# Altium footprint library connector_degson.PcbLib: 59 footprints (part 3 of 4)
Each footprint in its own frame and in the unit in brackets; x right, y up, seen from the top. Pads: shape width x height; smd on the part's side, far side on the other; paste and mask are expansions set on the pad; w line width, h text height; cw(c..) or ccw(c..) is an arc to the next point about the centre after c.
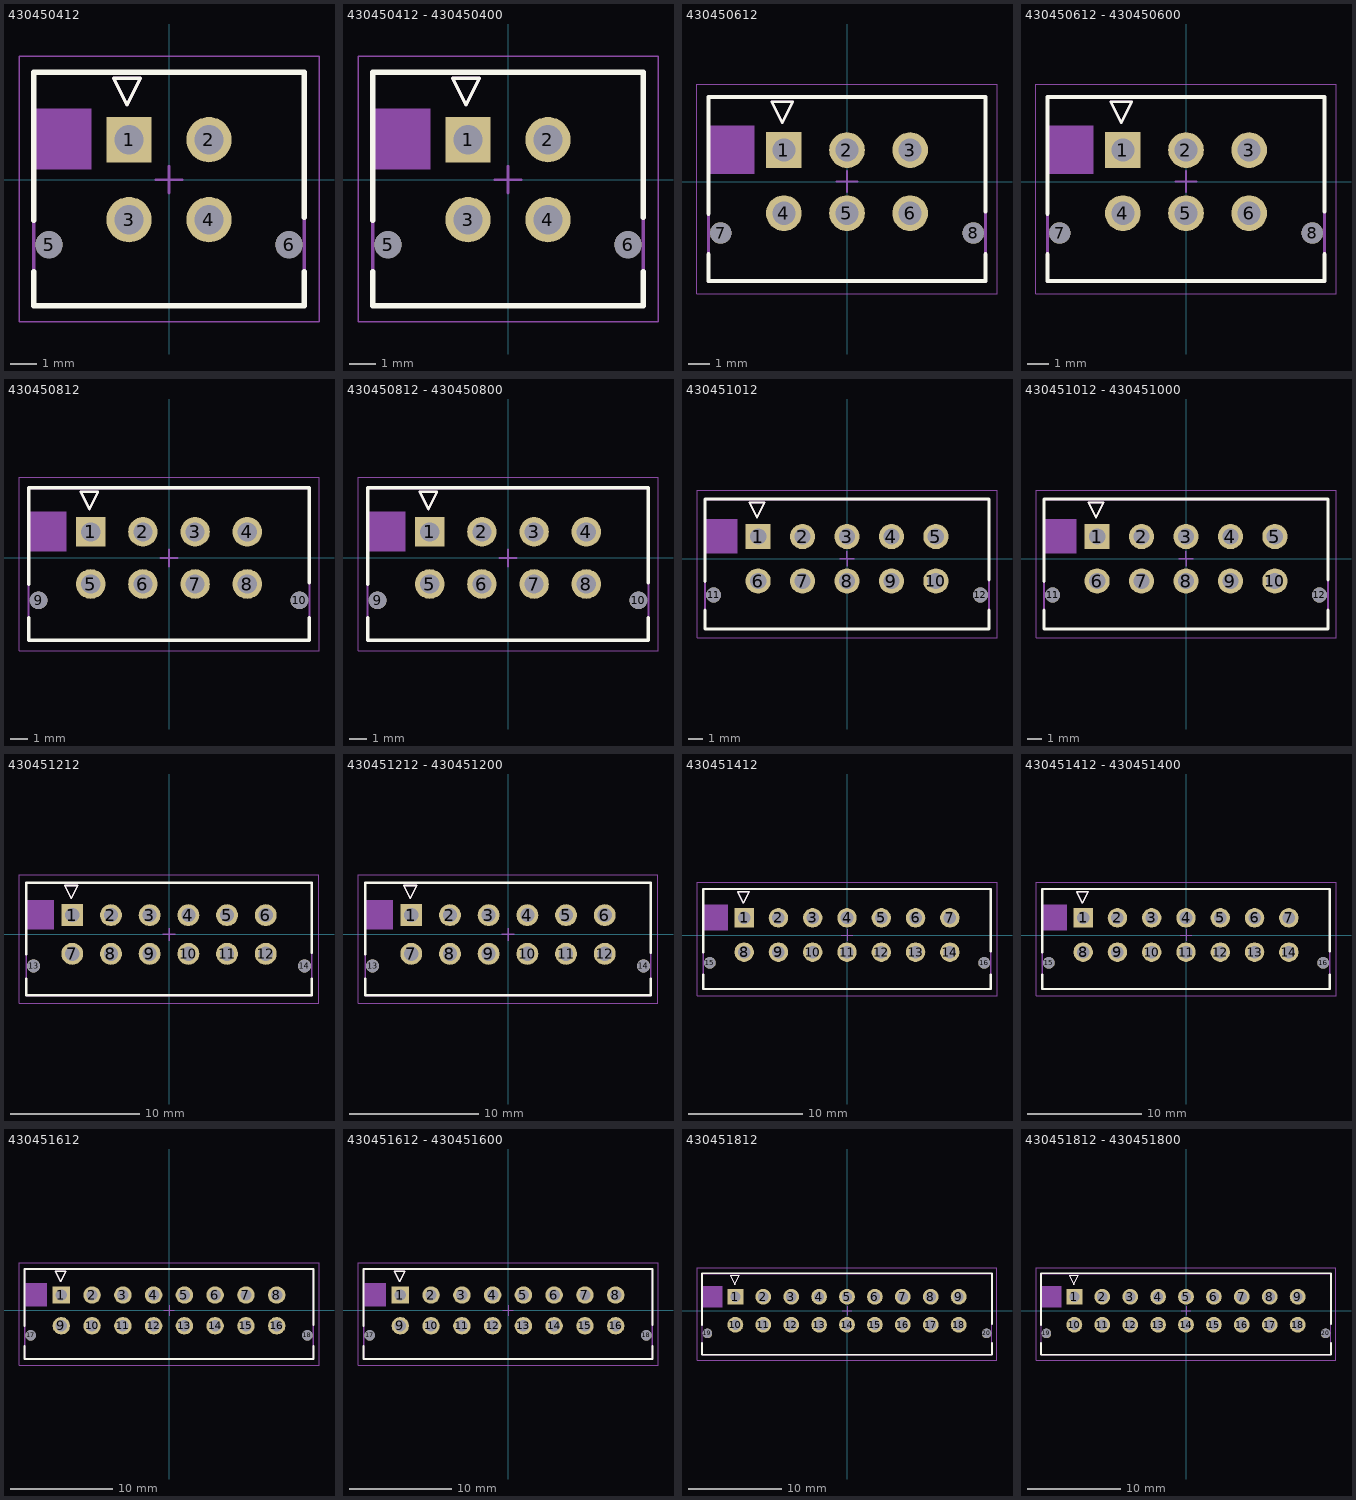
[diagram p2: the footprints below, top view; thin cyan lines are the x and y axes]

## 430450412 [mm] "Micro-Fit 3.0 Vertical Header, 3.00mm Pitch, Dual Row,  with PCB Polarizing Peg, 1.52µm Matte Tin Plating, Glow-Wire Capable, Black"
pads (6):
  rect 1.7x1.7 hole 1.1: 1(-1.5,1.5)
  round 1.7 hole 1.1: 2(1.5,1.5) 3(-1.5,-1.5) 4(1.5,-1.5)
  round 1.02 hole 1.02: 5(-4.5,-2.44) 6(4.5,-2.44)
Top Overlay:
  lines w0.127: -2.075,3.8 -1.075,3.8 -1.575,2.8 -2.075,3.8
  lines w0.2: -5.075,-3.45 -5.075,-4.725 5.075,-4.725 5.075,-3.45 ; -5.075,-1.525 -5.075,4.025 5.075,4.025 5.075,-1.42
Route Tool Path:
  text "%R" at -1.001,1.872 h1.27
Top Designator:
  text ".Designator" at -3.021,4.92 h0.6
Top Assembly:
  rectangle: -5.062,0.372 -2.904,2.678
  lines w0.127: -5.075,-4.75 -5.075,4 5.075,4 5.075,-4.75 -5.075,-4.75 ; -2.075,3.8 -1.575,2.8 -1.075,3.8 -2.075,3.8
Top Courtyard:
  lines w0.05: -5.625,-5.325 5.625,-5.325 5.625,4.625 -5.625,4.625 -5.625,-5.325
  lines w0.1: -0.5,0 0.5,0 ; 0,-0.5 0,0.5
3D body "0430450412.stp": height 10.05, standoff -3.04, extent -5.075,-4.83 5.075,3.94

## 430450412 - 430450400 [mm] "Micro-Fit 3.0 Vertical Header, 3.00mm Pitch, Dual Row,  with PCB Polarizing Peg, 1.52µm Matte Tin Plating, Glow-Wire Capable, Black"
pads (6):
  rect 1.7x1.7 hole 1.1: 1(-1.5,1.5)
  round 1.7 hole 1.1: 2(1.5,1.5) 3(-1.5,-1.5) 4(1.5,-1.5)
  round 1.02 hole 1.02: 5(-4.5,-2.44) 6(4.5,-2.44)
Top Overlay:
  lines w0.127: -2.075,3.8 -1.575,2.8 -1.075,3.8 -2.075,3.8
  lines w0.2: -5.075,-3.45 -5.075,-4.725 5.075,-4.725 5.075,-3.45 ; -5.075,-1.525 -5.075,4.025 5.075,4.025 5.075,-1.42
Route Tool Path:
  text "%R" at -1.001,1.872 h1.27
Top Designator:
  text ".Designator" at -3.021,4.92 h0.6
Top Assembly:
  rectangle: -5.062,0.372 -2.904,2.678
  lines w0.127: -5.075,-4.75 5.075,-4.75 5.075,4 -5.075,4 -5.075,-4.75 ; -2.075,3.8 -1.575,2.8 -1.075,3.8 -2.075,3.8
Top Courtyard:
  lines w0.05: -5.625,-5.325 -5.625,4.625 5.625,4.625 5.625,-5.325 -5.625,-5.325
  lines w0.1: -0.5,0 0.5,0 ; 0,-0.5 0,0.5
3D body "0430450412.stp": height 10.05, standoff -3.04, extent -5.075,-4.83 5.075,3.94
3D body "0430250400.stp": height 17.8, standoff 3.8, extent -4.14,-6.7 4.13,4.13

## 430450612 [mm] "Micro-Fit 3.0 Vertical Header, 3.00mm Pitch, Dual Row,  with PCB Polarizing Peg, 1.52µm Matte Tin Plating, Glow-Wire Capable, Black"
pads (8):
  rect 1.7x1.7 hole 1.1: 1(-3,1.5)
  round 1.7 hole 1.1: 2(0,1.5) 3(3,1.5) 4(-3,-1.5) 5(0,-1.5) 6(3,-1.5)
  round 1.02 hole 1.02: 7(-6,-2.44) 8(6,-2.44)
Top Overlay:
  lines w0.127: -3.575,3.8 -2.575,3.8 -3.075,2.8 -3.575,3.8
  lines w0.2: -6.575,-3.45 -6.575,-4.725 6.575,-4.725 6.575,-3.45 ; -6.575,-1.525 -6.575,4.025 6.575,4.025 6.575,-1.42
Route Tool Path:
  text "%R" at -2.501,1.872 h1.27
Top Designator:
  text ".Designator" at -3.033,4.975 h0.6
Top Assembly:
  rectangle: -6.562,0.372 -4.404,2.678
  lines w0.127: -6.575,-4.75 -6.575,4 6.575,4 6.575,-4.75 -6.575,-4.75 ; -3.575,3.8 -2.575,3.8 -3.075,2.8 -3.575,3.8
Top Courtyard:
  lines w0.05: -7.125,-5.325 7.125,-5.325 7.125,4.625 -7.125,4.625 -7.125,-5.325
  lines w0.1: -0.5,0 0.5,0 ; 0,-0.5 0,0.5
3D body "0430450612.stp": height 10.05, standoff -3.04, extent -6.575,-4.83 6.575,3.94

## 430450612 - 430450600 [mm] "Micro-Fit 3.0 Vertical Header, 3.00mm Pitch, Dual Row,  with PCB Polarizing Peg, 1.52µm Matte Tin Plating, Glow-Wire Capable, Black"
pads (8):
  rect 1.7x1.7 hole 1.1: 1(-3,1.5)
  round 1.7 hole 1.1: 2(0,1.5) 3(3,1.5) 4(-3,-1.5) 5(0,-1.5) 6(3,-1.5)
  round 1.02 hole 1.02: 7(-6,-2.44) 8(6,-2.44)
Top Overlay:
  lines w0.127: -3.575,3.8 -2.575,3.8 -3.075,2.8 -3.575,3.8
  lines w0.2: -6.575,-3.45 -6.575,-4.725 6.575,-4.725 6.575,-3.45 ; -6.575,-1.525 -6.575,4.025 6.575,4.025 6.575,-1.42
Route Tool Path:
  text "%R" at -2.501,1.872 h1.27
Top Designator:
  text ".Designator" at -3.033,4.975 h0.6
Top Assembly:
  rectangle: -6.562,0.372 -4.404,2.678
  lines w0.127: -6.575,-4.75 -6.575,4 6.575,4 6.575,-4.75 -6.575,-4.75 ; -3.575,3.8 -2.575,3.8 -3.075,2.8 -3.575,3.8
Top Courtyard:
  lines w0.05: -7.125,-5.325 7.125,-5.325 7.125,4.625 -7.125,4.625 -7.125,-5.325
  lines w0.1: -0.5,0 0.5,0 ; 0,-0.5 0,0.5
3D body "0430250600.stp": height 17.8, standoff 3.8, extent -4.93,-6.7 4.92,4.13
3D body "0430450612.stp": height 10.05, standoff -3.04, extent -6.575,-4.83 6.575,3.94

## 430450812 [mm] "Micro-Fit 3.0 Vertical Header, 3.00mm Pitch, Dual Row,  with PCB Polarizing Peg, 1.52µm Matte Tin Plating, Glow-Wire Capable, Black"
pads (10):
  rect 1.7x1.7 hole 1.1: 1(-4.5,1.5)
  round 1.7 hole 1.1: 2(-1.5,1.5) 3(1.5,1.5) 4(4.5,1.5) 5(-4.5,-1.5) 6(-1.5,-1.5) 7(1.5,-1.5) 8(4.5,-1.5)
  round 1.02 hole 1.02: 9(-7.5,-2.44) 10(7.5,-2.44)
Top Overlay:
  lines w0.127: -5.075,3.8 -4.075,3.8 -4.575,2.8 -5.075,3.8
  lines w0.2: -8.075,-3.45 -8.075,-4.725 8.075,-4.725 8.075,-3.45 ; -8.075,-1.525 -8.075,4.025 8.075,4.025 8.075,-1.42
Route Tool Path:
  text "%R" at -4.001,1.872 h1.27
Top Designator:
  text ".Designator" at -1.474,5.1 h0.6
Top Assembly:
  rectangle: -8.062,0.372 -5.904,2.678
  lines w0.127: -8.075,-4.75 -8.075,4 8.075,4 8.075,-4.75 -8.075,-4.75 ; -5.075,3.8 -4.075,3.8 -4.575,2.8 -5.075,3.8
Top Courtyard:
  lines w0.05: -8.625,-5.325 8.625,-5.325 8.625,4.625 -8.625,4.625 -8.625,-5.325
  lines w0.1: -0.5,0 0.5,0 ; 0,-0.5 0,0.5
3D body "0430450812.stp": height 10.05, standoff -3.04, extent -8.075,-4.83 8.075,3.94

## 430450812 - 430450800 [mm] "Micro-Fit 3.0 Vertical Header, 3.00mm Pitch, Dual Row,  with PCB Polarizing Peg, 1.52µm Matte Tin Plating, Glow-Wire Capable, Black"
pads (10):
  rect 1.7x1.7 hole 1.1: 1(-4.5,1.5)
  round 1.7 hole 1.1: 2(-1.5,1.5) 3(1.5,1.5) 4(4.5,1.5) 5(-4.5,-1.5) 6(-1.5,-1.5) 7(1.5,-1.5) 8(4.5,-1.5)
  round 1.02 hole 1.02: 9(-7.5,-2.44) 10(7.5,-2.44)
Top Overlay:
  lines w0.127: -5.075,3.8 -4.575,2.8 -4.075,3.8 -5.075,3.8
  lines w0.2: -8.075,-3.45 -8.075,-4.725 8.075,-4.725 8.075,-3.45 ; -8.075,-1.525 -8.075,4.025 8.075,4.025 8.075,-1.42
Route Tool Path:
  text "%R" at -4.001,1.872 h1.27
Top Designator:
  text ".Designator" at -1.474,5.1 h0.6
Top Assembly:
  rectangle: -8.062,0.372 -5.904,2.678
  lines w0.127: -8.075,-4.75 8.075,-4.75 8.075,4 -8.075,4 -8.075,-4.75 ; -5.075,3.8 -4.575,2.8 -4.075,3.8 -5.075,3.8
Top Courtyard:
  lines w0.05: -8.625,-5.325 -8.625,4.625 8.625,4.625 8.625,-5.325 -8.625,-5.325
  lines w0.1: -0.5,0 0.5,0 ; 0,-0.5 0,0.5
3D body "0430250800.stp": height 17.8, standoff 3.8, extent -6.43,-6.7 6.42,4.13
3D body "0430450812.stp": height 10.05, standoff -3.04, extent -8.075,-4.83 8.075,3.94

## 430451012 [mm] "Micro-Fit 3.0 Vertical Header, 3.00mm Pitch, Dual Row,  with PCB Polarizing Peg, 1.52µm Matte Tin Plating, Glow-Wire Capable, Black"
pads (12):
  rect 1.7x1.7 hole 1.1: 1(-6,1.5)
  round 1.7 hole 1.1: 2(-3,1.5) 3(0,1.5) 4(3,1.5) 5(6,1.5) 6(-6,-1.5) 7(-3,-1.5) 8(0,-1.5) 9(3,-1.5) 10(6,-1.5)
  round 1.02 hole 1.02: 11(-9,-2.44) 12(9,-2.44)
Top Overlay:
  lines w0.127: -6.575,3.8 -5.575,3.8 -6.075,2.8 -6.575,3.8
  lines w0.2: -9.575,-3.45 -9.575,-4.725 9.575,-4.725 9.575,-3.45 ; -9.575,-1.525 -9.575,4.025 9.575,4.025 9.575,-1.42
Route Tool Path:
  text "%R" at -5.501,1.872 h1.27
Top Designator:
  text ".Designator" at -2.974,5.1 h0.6
Top Assembly:
  rectangle: -9.562,0.372 -7.404,2.678
  lines w0.127: -9.575,-4.75 -9.575,4 9.575,4 9.575,-4.75 -9.575,-4.75 ; -6.575,3.8 -5.575,3.8 -6.075,2.8 -6.575,3.8
Top Courtyard:
  lines w0.05: -10.125,-5.325 10.125,-5.325 10.125,4.625 -10.125,4.625 -10.125,-5.325
  lines w0.1: -0.5,0 0.5,0 ; 0,-0.5 0,0.5
3D body "43045-1012.stp": height 9.95, standoff -3.14, extent -9.575,-4.83 9.575,3.94

## 430451012 - 430451000 [mm] "Micro-Fit 3.0 Vertical Header, 3.00mm Pitch, Dual Row,  with PCB Polarizing Peg, 1.52µm Matte Tin Plating, Glow-Wire Capable, Black"
pads (12):
  rect 1.7x1.7 hole 1.1: 1(-6,1.5)
  round 1.7 hole 1.1: 2(-3,1.5) 3(0,1.5) 4(3,1.5) 5(6,1.5) 6(-6,-1.5) 7(-3,-1.5) 8(0,-1.5) 9(3,-1.5) 10(6,-1.5)
  round 1.02 hole 1.02: 11(-9,-2.44) 12(9,-2.44)
Top Overlay:
  lines w0.127: -6.575,3.8 -5.575,3.8 -6.075,2.8 -6.575,3.8
  lines w0.2: -9.575,-3.45 -9.575,-4.725 9.575,-4.725 9.575,-3.45 ; -9.575,-1.525 -9.575,4.025 9.575,4.025 9.575,-1.42
Route Tool Path:
  text "%R" at -5.501,1.872 h1.27
Top Designator:
  text ".Designator" at -2.974,5.1 h0.6
Top Assembly:
  rectangle: -9.562,0.372 -7.404,2.678
  lines w0.127: -9.575,-4.75 -9.575,4 9.575,4 9.575,-4.75 -9.575,-4.75 ; -6.575,3.8 -5.575,3.8 -6.075,2.8 -6.575,3.8
Top Courtyard:
  lines w0.05: -10.125,-5.325 10.125,-5.325 10.125,4.625 -10.125,4.625 -10.125,-5.325
  lines w0.1: -0.5,0 0.5,0 ; 0,-0.5 0,0.5
3D body "0430251000.stp": height 17.8, standoff 3.8, extent -7.93,-6.7 7.92,4.13
3D body "43045-1012.stp": height 9.95, standoff -3.14, extent -9.575,-4.83 9.575,3.94

## 430451212 [mm] "Micro-Fit 3.0 Vertical Header, 3.00mm Pitch, Dual Row,  with PCB Polarizing Peg, 1.52µm Matte Tin Plating, Glow-Wire Capable, Black"
pads (14):
  rect 1.7x1.7 hole 1.1: 1(-7.5,1.5)
  round 1.7 hole 1.1: 2(-4.5,1.5) 3(-1.5,1.5) 4(1.5,1.5) 5(4.5,1.5) 6(7.5,1.5) 7(-7.5,-1.5) 8(-4.5,-1.5) 9(-1.5,-1.5) 10(1.5,-1.5) 11(4.5,-1.5) 12(7.5,-1.5)
  round 1.02 hole 1.02: 13(-10.5,-2.44) 14(10.5,-2.44)
Top Overlay:
  lines w0.127: -8.075,3.8 -7.575,2.8 -7.075,3.8 -8.075,3.8
  lines w0.2: -11.075,-3.45 -11.075,-4.725 11.075,-4.725 11.075,-3.45 ; -11.075,-1.525 -11.075,4.025 11.075,4.025 11.075,-1.42
Route Tool Path:
  text "%R" at -7.001,1.872 h1.27
Top Designator:
  text ".Designator" at -4.474,5.1 h0.6
Top Assembly:
  rectangle: -11.062,0.372 -8.904,2.678
  lines w0.127: -11.075,-4.75 11.075,-4.75 11.075,4 -11.075,4 -11.075,-4.75 ; -8.075,3.8 -7.575,2.8 -7.075,3.8 -8.075,3.8
Top Courtyard:
  lines w0.05: -11.625,-5.325 -11.625,4.625 11.625,4.625 11.625,-5.325 -11.625,-5.325
  lines w0.1: -0.5,0 0.5,0 ; 0,-0.5 0,0.5
3D body "0430451212.stp": height 10.05, standoff -3.04, extent -11.075,-4.83 11.075,3.94

## 430451212 - 430451200 [mm] "Micro-Fit 3.0 Vertical Header, 3.00mm Pitch, Dual Row,  with PCB Polarizing Peg, 1.52µm Matte Tin Plating, Glow-Wire Capable, Black"
pads (14):
  rect 1.7x1.7 hole 1.1: 1(-7.5,1.5)
  round 1.7 hole 1.1: 2(-4.5,1.5) 3(-1.5,1.5) 4(1.5,1.5) 5(4.5,1.5) 6(7.5,1.5) 7(-7.5,-1.5) 8(-4.5,-1.5) 9(-1.5,-1.5) 10(1.5,-1.5) 11(4.5,-1.5) 12(7.5,-1.5)
  round 1.02 hole 1.02: 13(-10.5,-2.44) 14(10.5,-2.44)
Top Overlay:
  lines w0.127: -8.075,3.8 -7.575,2.8 -7.075,3.8 -8.075,3.8
  lines w0.2: -11.075,-3.45 -11.075,-4.725 11.075,-4.725 11.075,-3.45 ; -11.075,-1.525 -11.075,4.025 11.075,4.025 11.075,-1.42
Route Tool Path:
  text "%R" at -7.001,1.872 h1.27
Top Designator:
  text ".Designator" at -4.474,5.1 h0.6
Top Assembly:
  rectangle: -11.062,0.372 -8.904,2.678
  lines w0.127: -11.075,-4.75 11.075,-4.75 11.075,4 -11.075,4 -11.075,-4.75 ; -8.075,3.8 -7.575,2.8 -7.075,3.8 -8.075,3.8
Top Courtyard:
  lines w0.05: -11.625,-5.325 -11.625,4.625 11.625,4.625 11.625,-5.325 -11.625,-5.325
  lines w0.1: -0.5,0 0.5,0 ; 0,-0.5 0,0.5
3D body "0430251200.stp": height 17.8, standoff 3.8, extent -9.43,-6.7 9.42,4.13
3D body "0430451212.stp": height 10.05, standoff -3.04, extent -11.075,-4.83 11.075,3.94

## 430451412 [mm] "Micro-Fit 3.0 Vertical Header, 3.00mm Pitch, Dual Row,  with PCB Polarizing Peg, 1.52µm Matte Tin Plating, Glow-Wire Capable, Black"
pads (16):
  rect 1.7x1.7 hole 1.1: 1(-9,1.5)
  round 1.7 hole 1.1: 2(-6,1.5) 3(-3,1.5) 4(0,1.5) 5(3,1.5) 6(6,1.5) 7(9,1.5) 8(-9,-1.5) 9(-6,-1.5) 10(-3,-1.5) 11(0,-1.5) 12(3,-1.5) 13(6,-1.5) 14(9,-1.5)
  round 1.02 hole 1.02: 15(-12,-2.44) 16(12,-2.44)
Top Overlay:
  lines w0.127: -9.575,3.8 -9.075,2.8 -8.575,3.8 -9.575,3.8
  lines w0.2: -12.575,-3.45 -12.575,-4.725 12.575,-4.725 12.575,-3.45 ; -12.575,-1.525 -12.575,4.025 12.575,4.025 12.575,-1.42
Route Tool Path:
  text "%R" at -8.501,1.872 h1.27
Top Designator:
  text ".Designator" at -2.926,5.114 h0.6
Top Assembly:
  rectangle: -12.562,0.372 -10.404,2.678
  lines w0.127: -12.575,-4.75 12.575,-4.75 12.575,4 -12.575,4 -12.575,-4.75 ; -9.575,3.8 -9.075,2.8 -8.575,3.8 -9.575,3.8
Top Courtyard:
  lines w0.05: -13.125,-5.325 -13.125,4.625 13.125,4.625 13.125,-5.325 -13.125,-5.325
  lines w0.1: -0.5,0 0.5,0 ; 0,-0.5 0,0.5
3D body "0430451412.stp": height 10.05, standoff -3.04, extent -12.575,-4.83 12.575,3.94

## 430451412 - 430451400 [mm] "Micro-Fit 3.0 Vertical Header, 3.00mm Pitch, Dual Row,  with PCB Polarizing Peg, 1.52µm Matte Tin Plating, Glow-Wire Capable, Black"
pads (16):
  rect 1.7x1.7 hole 1.1: 1(-9,1.5)
  round 1.7 hole 1.1: 2(-6,1.5) 3(-3,1.5) 4(0,1.5) 5(3,1.5) 6(6,1.5) 7(9,1.5) 8(-9,-1.5) 9(-6,-1.5) 10(-3,-1.5) 11(0,-1.5) 12(3,-1.5) 13(6,-1.5) 14(9,-1.5)
  round 1.02 hole 1.02: 15(-12,-2.44) 16(12,-2.44)
Top Overlay:
  lines w0.127: -9.575,3.8 -8.575,3.8 -9.075,2.8 -9.575,3.8
  lines w0.2: -12.575,-3.45 -12.575,-4.725 12.575,-4.725 12.575,-3.45 ; -12.575,-1.525 -12.575,4.025 12.575,4.025 12.575,-1.42
Route Tool Path:
  text "%R" at -8.501,1.872 h1.27
Top Designator:
  text ".Designator" at -2.926,5.114 h0.6
Top Assembly:
  rectangle: -12.562,0.372 -10.404,2.678
  lines w0.127: -12.575,-4.75 -12.575,4 12.575,4 12.575,-4.75 -12.575,-4.75 ; -9.575,3.8 -8.575,3.8 -9.075,2.8 -9.575,3.8
Top Courtyard:
  lines w0.05: -13.125,-5.325 13.125,-5.325 13.125,4.625 -13.125,4.625 -13.125,-5.325
  lines w0.1: -0.5,0 0.5,0 ; 0,-0.5 0,0.5
3D body "0430451412.stp": height 10.05, standoff -3.04, extent -12.575,-4.83 12.575,3.94
3D body "0430251400.stp": height 17.8, standoff 3.8, extent -10.93,-6.7 10.92,4.13

## 430451612 [mm] "Micro-Fit 3.0 Vertical Header, 3.00mm Pitch, Dual Row,  with PCB Polarizing Peg, 1.52µm Matte Tin Plating, Glow-Wire Capable, Black"
pads (18):
  rect 1.7x1.7 hole 1.1: 1(-10.5,1.5)
  round 1.7 hole 1.1: 2(-7.5,1.5) 3(-4.5,1.5) 4(-1.5,1.5) 5(1.5,1.5) 6(4.5,1.5) 7(7.5,1.5) 8(10.5,1.5) 9(-10.5,-1.5) 10(-7.5,-1.5) 11(-4.5,-1.5) 12(-1.5,-1.5) 13(1.5,-1.5) 14(4.5,-1.5) 15(7.5,-1.5) 16(10.5,-1.5)
  round 1.02 hole 1.02: 17(-13.5,-2.44) 18(13.5,-2.44)
Top Overlay:
  lines w0.127: -11.075,3.8 -10.075,3.8 -10.575,2.8 -11.075,3.8
  lines w0.2: -14.075,-3.45 -14.075,-4.725 14.075,-4.725 14.075,-3.45 ; -14.075,-1.525 -14.075,4.025 14.075,4.025 14.075,-1.42
Route Tool Path:
  text "%R" at -10.001,1.872 h1.27
Top Designator:
  text ".Designator" at -2.677,4.925 h0.6
Top Assembly:
  rectangle: -14.062,0.372 -11.904,2.678
  lines w0.127: -14.075,-4.75 -14.075,4 14.075,4 14.075,-4.75 -14.075,-4.75 ; -11.075,3.8 -10.075,3.8 -10.575,2.8 -11.075,3.8
Top Courtyard:
  lines w0.05: -14.625,-5.325 14.625,-5.325 14.625,4.625 -14.625,4.625 -14.625,-5.325
  lines w0.1: -0.5,0 0.5,0 ; 0,-0.5 0,0.5
3D body "0430451612.stp": height 10.05, standoff -3.04, extent -14.075,-4.83 14.075,3.94

## 430451612 - 430451600 [mm] "Micro-Fit 3.0 Vertical Header, 3.00mm Pitch, Dual Row,  with PCB Polarizing Peg, 1.52µm Matte Tin Plating, Glow-Wire Capable, Black"
pads (18):
  rect 1.7x1.7 hole 1.1: 1(-10.5,1.5)
  round 1.7 hole 1.1: 2(-7.5,1.5) 3(-4.5,1.5) 4(-1.5,1.5) 5(1.5,1.5) 6(4.5,1.5) 7(7.5,1.5) 8(10.5,1.5) 9(-10.5,-1.5) 10(-7.5,-1.5) 11(-4.5,-1.5) 12(-1.5,-1.5) 13(1.5,-1.5) 14(4.5,-1.5) 15(7.5,-1.5) 16(10.5,-1.5)
  round 1.02 hole 1.02: 17(-13.5,-2.44) 18(13.5,-2.44)
Top Overlay:
  lines w0.127: -11.075,3.8 -10.075,3.8 -10.575,2.8 -11.075,3.8
  lines w0.2: -14.075,-3.45 -14.075,-4.725 14.075,-4.725 14.075,-3.45 ; -14.075,-1.525 -14.075,4.025 14.075,4.025 14.075,-1.42
Route Tool Path:
  text "%R" at -10.001,1.872 h1.27
Top Designator:
  text ".Designator" at -2.677,4.925 h0.6
Top Assembly:
  rectangle: -14.062,0.372 -11.904,2.678
  lines w0.127: -14.075,-4.75 -14.075,4 14.075,4 14.075,-4.75 -14.075,-4.75 ; -11.075,3.8 -10.075,3.8 -10.575,2.8 -11.075,3.8
Top Courtyard:
  lines w0.05: -14.625,-5.325 14.625,-5.325 14.625,4.625 -14.625,4.625 -14.625,-5.325
  lines w0.1: -0.5,0 0.5,0 ; 0,-0.5 0,0.5
3D body "0430251600.stp": height 17.8, standoff 3.8, extent -12.43,-6.7 12.42,4.13
3D body "0430451612.stp": height 10.05, standoff -3.04, extent -14.075,-4.83 14.075,3.94

## 430451812 [mm] "Micro-Fit 3.0 Vertical Header, 3.00mm Pitch, Dual Row,  with PCB Polarizing Peg, 1.52µm Matte Tin Plating, Glow-Wire Capable, Black"
pads (20):
  rect 1.7x1.7 hole 1.1: 1(-12,1.5)
  round 1.7 hole 1.1: 2(-9,1.5) 3(-6,1.5) 4(-3,1.5) 5(0,1.5) 6(3,1.5) 7(6,1.5) 8(9,1.5) 9(12,1.5) 10(-12,-1.5) 11(-9,-1.5) 12(-6,-1.5) 13(-3,-1.5) 14(0,-1.5) 15(3,-1.5) 16(6,-1.5) 17(9,-1.5) 18(12,-1.5)
  round 1.02 hole 1.02: 19(-15,-2.44) 20(15,-2.44)
Top Overlay:
  lines w0.127: -12.575,3.8 -12.075,2.8 -11.575,3.8 -12.575,3.8
  lines w0.2: -15.575,-3.45 -15.575,-4.725 15.538,-4.725 ; -15.575,-1.525 -15.575,4.025 15.575,4.025 15.575,-1.42 ; 15.575,-4.725 15.575,-3.45
Route Tool Path:
  text "%R" at -11.501,1.872 h1.27
Top Designator:
  text ".Designator" at -1.635,4.993 h0.6
Top Assembly:
  rectangle: -15.562,0.372 -13.404,2.678
  lines w0.127: -15.575,-4.75 15.575,-4.75 15.575,4 -15.575,4 -15.575,-4.75 ; -12.575,3.8 -12.075,2.8 -11.575,3.8 -12.575,3.8
Top Courtyard:
  lines w0.05: -16.125,-5.325 -16.125,4.625 16.125,4.625 16.125,-5.325 -16.125,-5.325
  lines w0.1: -0.5,0 0.5,0 ; 0,-0.5 0,0.5
3D body "0430451812.stp": height 10.05, standoff -3.04, extent -15.575,-4.83 15.575,3.94

## 430451812 - 430451800 [mm] "Micro-Fit 3.0 Vertical Header, 3.00mm Pitch, Dual Row,  with PCB Polarizing Peg, 1.52µm Matte Tin Plating, Glow-Wire Capable, Black"
pads (20):
  rect 1.7x1.7 hole 1.1: 1(-12,1.5)
  round 1.7 hole 1.1: 2(-9,1.5) 3(-6,1.5) 4(-3,1.5) 5(0,1.5) 6(3,1.5) 7(6,1.5) 8(9,1.5) 9(12,1.5) 10(-12,-1.5) 11(-9,-1.5) 12(-6,-1.5) 13(-3,-1.5) 14(0,-1.5) 15(3,-1.5) 16(6,-1.5) 17(9,-1.5) 18(12,-1.5)
  round 1.02 hole 1.02: 19(-15,-2.44) 20(15,-2.44)
Top Overlay:
  lines w0.127: -12.575,3.8 -12.075,2.8 -11.575,3.8 -12.575,3.8
  lines w0.2: -15.575,-3.45 -15.575,-4.725 15.538,-4.725 ; -15.575,-1.525 -15.575,4.025 15.575,4.025 15.575,-1.42 ; 15.575,-4.725 15.575,-3.45
Route Tool Path:
  text "%R" at -11.501,1.872 h1.27
Top Designator:
  text ".Designator" at -1.635,4.993 h0.6
Top Assembly:
  rectangle: -15.562,0.372 -13.404,2.678
  lines w0.127: -15.575,-4.75 15.575,-4.75 15.575,4 -15.575,4 -15.575,-4.75 ; -12.575,3.8 -12.075,2.8 -11.575,3.8 -12.575,3.8
Top Courtyard:
  lines w0.05: -16.125,-5.325 -16.125,4.625 16.125,4.625 16.125,-5.325 -16.125,-5.325
  lines w0.1: -0.5,0 0.5,0 ; 0,-0.5 0,0.5
3D body "0430251800.stp": height 17.8, standoff 3.8, extent -13.93,-6.7 13.92,4.13
3D body "0430451812.stp": height 10.05, standoff -3.04, extent -15.575,-4.83 15.575,3.94